# Altium footprint library RPIadaptor.PcbLib: 85 footprints (part 2 of 6)
Each footprint in its own frame and in the unit in brackets; x right, y up, seen from the top. Pads: shape width x height; smd on the part's side, far side on the other; paste and mask are expansions set on the pad; w line width, h text height; cw(c..) or ccw(c..) is an arc to the next point about the centre after c.
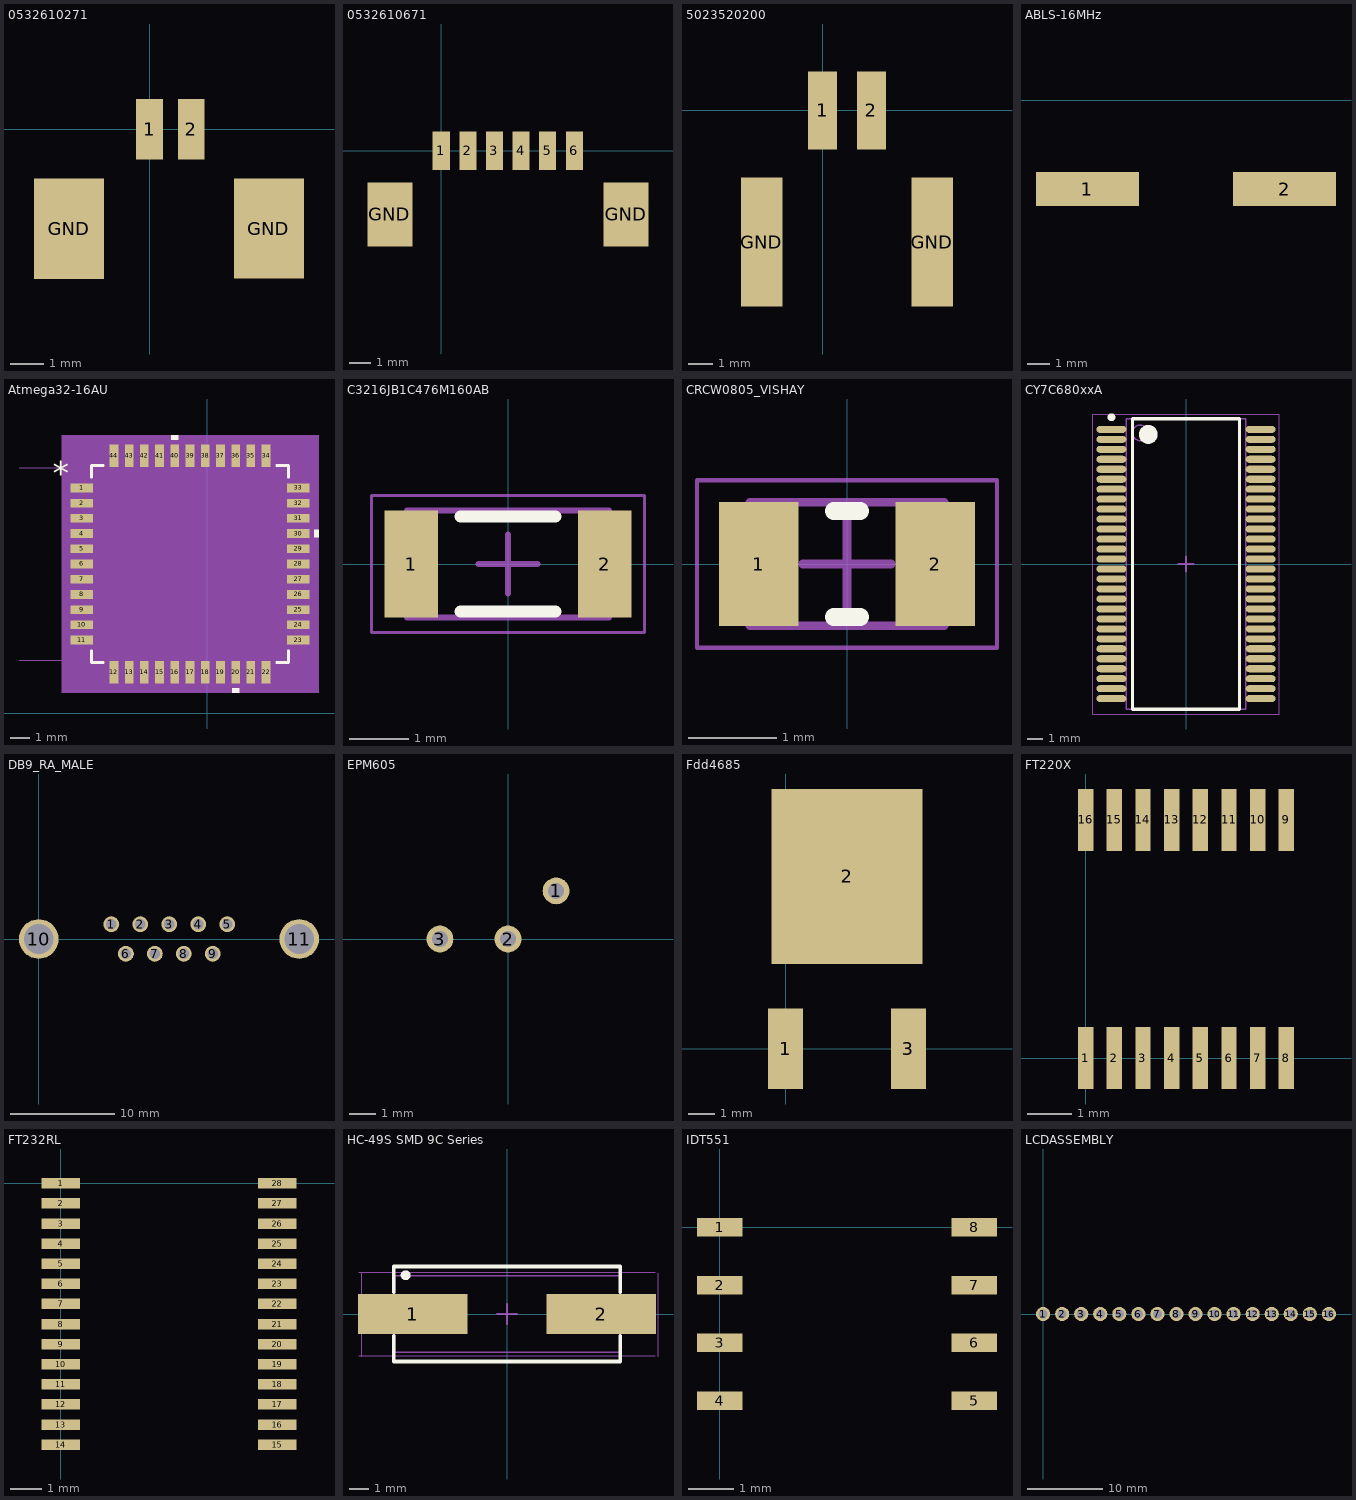
[diagram p1: the footprints below, top view; thin cyan lines are the x and y axes]

## 0532610271 [mm]
pads (4):
  rect 0.8x1.8 smd: 1(0,0) 2(1.25,0)
  rect 2.1x3 smd: GND(-2.41,-2.98) GND(3.575,-2.975)
3D body "532610271.stp": height 3.35, standoff -0.05, extent -3.225,-4.975 4.425,0.225

## 0532610671 [mm]
pads (8):
  rect 0.8x1.8 smd: 1(0,0) 2(1.25,0) 3(2.5,0) 4(3.75,0) 5(5,0) 6(6.25,0)
  rect 2.1x3 smd: GND(-2.41,-2.98) GND(8.68,-2.98)
3D body "532610671.stp": height 3.4, standoff 0, extent -3.205,-4.54 9.445,0.66

## 5023520200 [mm]
pads (4):
  rect 1.2x3.2 smd: 1(0,0) 2(2,0)
  rect 1.7x5.3 smd: GND(-2.5,-5.4) GND(4.5,-5.4)
3D body "5023520200.stp": height 6.46, standoff 0.06, extent -3,-8.4 5,1

## ABLS-16MHz [mil]
pads (2):
  rect 180x59.06 smd: 1(140,-155) 2(485,-155)
3D body: height 59.45, standoff -59.45, extent -75,40 -75,40
3D body "ABLS.STEP": height 160, standoff -4, extent 65.01,-247.49 565.01,-62.49

## Atmega32-16AU [mil]
pads (44):
  rect 46x18 smd paste+0 mask+0: 1(-260,466.48) 2(-260,434.98) 3(-260,403.49) 4(-260,371.99) 5(-260,340.5) 6(-260,309) 7(-260,277.5) 8(-260,246.01) 9(-260,214.51) 10(-260,183.02) 11(-260,151.52) 23(188,151.52) 24(188,183.02) 25(188,214.51) 26(188,246.01) 27(188,277.5) 28(188,309) 29(188,340.5) 30(188,371.99) 31(188,403.49) 32(188,434.98) 33(188,466.48)
  rect 18x46 smd paste+0 mask+0: 12(-193.48,85) 13(-161.98,85) 14(-130.49,85) 15(-98.99,85) 16(-67.5,85) 17(-36,85) 18(-4.5,85) 19(26.99,85) 20(58.49,85) 21(89.98,85) 22(121.48,85) 34(121.48,533) 35(89.98,533) 36(58.49,533) 37(26.99,533) 38(-4.5,533) 39(-36,533) 40(-67.5,533) 41(-98.99,533) 42(-130.49,533) 43(-161.98,533) 44(-193.48,533)
Top Overlay:
  region: -60,566 -75,566 -75,576 -60,576
  region: 221,379.49 231,379.49 231,364.49 221,364.49
  region: 65.99,52 50.99,52 50.99,42 65.99,42
  lines w6: -240,129.42 -240,105 -215.58,105 ; -240,488.58 -240,513 -215.58,513 ; 143.58,105 168,105 168,129.42 ; 143.58,513 168,513 168,488.58
  text "*" at -320.5,472.23 h50
Mechanical 5:
  region: 230,43 -302,43 -302,575 230,575
Mechanical 7:
  lines w1: -390,110 -193.48,110 ; -390,508 -193.48,508
Mechanical 13:
  drawing of 181 lines, arcs and shapes, not listed
  text "*" at -232.5,457.23 h50
Mechanical 15:
  region: -206.48,106 -239,106 -239,138.52 -287,138.52 -287,479.48 -239,479.48 -239,512 -206.48,512 -206.48,560 134.48,560 134.48,512 167,512 167,479.48 215,479.48 215,138.52 167,138.52 167,106 134.48,106 134.48,58 -206.48,58
  lines w6: -287,138.52 -287,479.48 -239,479.48 -239,512 -206.48,512 -206.48,560 134.48,560 134.48,512 167,512 167,479.48 215,479.48 215,138.52 167,138.52 167,106 134.48,106 134.48,58 -206.48,58 -206.48,106 -239,106 -239,138.52 -287,138.52
3D body "44A-L.step": height 47.09, standoff 0, extent -276.98,68.02 204.99,549.99
3D body: height 10, standoff 0, extent -36,309 -26,319

## C3216JB1C476M160AB [mm]
height 1.8
pads (2):
  rect 0.9x1.8 smd: 1(-1.625,0) 2(1.625,0)
Top Overlay:
  lines w0.2: -0.8,-0.8 0.8,-0.8 ; -0.8,0.8 0.8,0.8
Mechanical 13:
  lines w0.1: -1.7,-0.9 1.7,-0.9 1.7,0.9 -1.7,0.9 -1.7,-0.9
Mechanical 15:
  lines w0.05: -2.3,-1.15 2.3,-1.15 2.3,1.15 -2.3,1.15 -2.3,-1.15
  lines w0.1: -0.5,0 0.5,0 ; 0,-0.5 0,0.5
3D body "C3216JB1C476M160AB.step": height 1.8, standoff 0, extent -1.7,-0.9 1.7,0.9

## CRCW0805_VISHAY [mm]
height 0.5
pads (2):
  rect 0.9x1.4 smd: 1(-1,0) 2(1,0)
Top Overlay:
  lines w0.2: -0.15,-0.6 0.15,-0.6 ; -0.15,0.6 0.15,0.6
Mechanical 13:
  lines w0.1: -1.1,-0.7 -1.1,0.7 1.1,0.7 1.1,-0.7 -1.1,-0.7
Mechanical 15:
  lines w0.05: -1.7,-0.95 -1.7,0.95 1.7,0.95 1.7,-0.95 -1.7,-0.95
  lines w0.1: -0.5,0 0.5,0 ; 0,-0.5 0,0.5
3D body "CRCW0805_VISHAY.step": height 0.5, standoff 0, extent -1.1,-0.7 1.1,0.7

## CY7C680xxA [mm]
height 2.8
pads (56):
  oval 1.9x0.45 smd: 1(-4.75,8.572) 2(-4.75,7.938) 3(-4.75,7.302) 4(-4.75,6.667) 5(-4.75,6.032) 6(-4.75,5.397) 7(-4.75,4.763) 8(-4.75,4.127) 9(-4.75,3.492) 10(-4.75,2.857) 11(-4.75,2.222) 12(-4.75,1.587) 13(-4.75,0.953) 14(-4.75,0.318) 15(-4.75,-0.318) 16(-4.75,-0.953) 17(-4.75,-1.587) 18(-4.75,-2.222) 19(-4.75,-2.857) 20(-4.75,-3.492) 21(-4.75,-4.127) 22(-4.75,-4.763) 23(-4.75,-5.397) 24(-4.75,-6.032) 25(-4.75,-6.667) 26(-4.75,-7.302) 27(-4.75,-7.938) 28(-4.75,-8.572) 29(4.75,-8.572) 30(4.75,-7.938) 31(4.75,-7.302) 32(4.75,-6.667) 33(4.75,-6.032) 34(4.75,-5.397) 35(4.75,-4.763) 36(4.75,-4.127) 37(4.75,-3.492) 38(4.75,-2.857) 39(4.75,-2.222) 40(4.75,-1.587) 41(4.75,-0.953) 42(4.75,-0.318) 43(4.75,0.318) 44(4.75,0.953) 45(4.75,1.587) 46(4.75,2.222) 47(4.75,2.857) 48(4.75,3.492) 49(4.75,4.127) 50(4.75,4.763) 51(4.75,5.397) 52(4.75,6.032) 53(4.75,6.667) 54(4.75,7.302) 55(4.75,7.938) 56(4.75,8.572)
Top Overlay:
  circle w0.25: c-4.75,9.347 r0.125
  circle w0.6: c-2.4,8.25 r0.3
  lines w0.2: -3.4,-9.25 -3.4,9.25 3.4,9.25 3.4,-9.25 -3.4,-9.25
Mechanical 13:
  circle w0.1: c-2.9,8.35 r0.5
  lines w0.1: -3.8,-9.25 -3.8,9.25 3.8,9.25 3.8,-9.25 -3.8,-9.25
Mechanical 15:
  lines w0.05: -5.95,-9.55 -5.95,9.55 5.95,9.55 5.95,-9.55 -5.95,-9.55
  lines w0.1: -0.5,0 0.5,0 ; 0,-0.5 0,0.5
3D body "CY7C680xxA.step": height 2.79, standoff 0, extent -5.175,-9.25 5.175,9.25

## DB9_RA_MALE [mil]
pads (11):
  round 60 hole 39.37: 1(274,56) 2(383.5,56) 3(493,56) 4(602.5,56) 5(712,56) 6(329,-56) 7(438.5,-56) 8(548,-56) 9(657.5,-56)
  round 150 hole 111.81: 10(0,0) 11(983.86,0)
3D body "connector_a-ds_09_a_kg-t2.stp": height 497.05, standoff -167.32, extent -113.5,-617.28 1099.5,115

## EPM605 [mm]
pads (3):
  round 1 hole 0.6: 1(1.796,1.796) 2(0,0) 3(-2.54,0)
Bottom Overlay:
  lines w0.127: 3.562,4.321 ccw(c0,0) 4.29,3.6 ; 3.593,4.33 4.215,4.952 ; 4.218,4.952 4.939,4.231 4.317,3.608
3D body: height 1.25, standoff 0, extent 0,0 0,0

## Fdd4685 [mm]
pads (3):
  rect 1.3x3 smd: 1(0,0) 3(4.56,0)
  rect 5.6x6.5 smd: 2(2.28,6.4)
3D body "User Library-DPAK-1.STEP": height 2.41, standoff 0, extent -0.984,-0.858 5.556,9.081

## FT220X [mm]
pads (16):
  rect 0.35x1.4 smd: 1(0,0) 2(0.65,0) 3(1.3,0) 4(1.95,0) 5(2.6,0) 6(3.25,0) 7(3.9,0) 8(4.55,0) 9(4.55,5.4) 10(3.9,5.4) 11(3.25,5.4) 12(2.6,5.4) 13(1.95,5.4) 14(1.3,5.4) 15(0.65,5.4) 16(0,5.4)
3D body "User Library-TSSOP-16-1.STEP": height 1.1, standoff 0, extent -0.214,-0.533 4.786,5.867

## FT232RL [mm]
pads (28):
  rect 1.25x0.34 smd: 1(0,0) 2(0,-0.65) 3(0,-1.3) 4(0,-1.95) 5(0,-2.6) 6(0,-3.25) 7(0,-3.9) 8(0,-4.55) 9(0,-5.2) 10(0,-5.85) 11(0,-6.5) 12(0,-7.15) 13(0,-7.8) 14(0,-8.45) 15(7,-8.45) 16(7,-7.8) 17(7,-7.15) 18(7,-6.5) 19(7,-5.85) 20(7,-5.2) 21(7,-4.55) 22(7,-3.9) 23(7,-3.25) 24(7,-2.6) 25(7,-1.95) 26(7,-1.3) 27(7,-0.65) 28(7,0)
3D body "User Library-ssop28_model.STEP": height 2.01, standoff 0.01, extent -0.471,-9.311 7.329,0.889

## HC-49S SMD 9C Series [mm]
height 4.1
pads (2):
  rect 5.5x2 smd: 1(-4.75,0) 2(4.75,0)
Top Overlay:
  circle w0.25: c-5.1,1.95 r0.125
  lines w0.2: -5.7,-1.1 -5.7,-2.4 5.7,-2.4 5.7,-1.1 ; -5.7,1.1 -5.7,2.4 5.7,2.4 5.7,1.1
Mechanical 13:
  lines w0.1: -5.675,-1.925 5.675,-1.925 5.675,1.925 -5.675,1.925 -5.675,-1.925
Mechanical 15:
  lines w0.05: -7.45,-2.1 7.45,-2.1 ; -7.45,2.1 7.45,2.1 ; -7.3,-2.15 -7.3,2.05 ; 7.6,-2.15 7.6,2.05
  lines w0.1: -0.5,0 0.5,0 ; 0,-0.5 0,0.5
3D body "HC-49S SMD 9C Series.step": height 4.1, standoff 0, extent -6.2,-1.925 6.5,1.925

## IDT551 [mil]
pads (8):
  rect 39.37x16 smd: 1(0,0) 2(0,-50) 3(0,-100) 4(0,-150) 5(220,-150) 6(220,-100) 7(220,-50) 8(220,0)
3D body "User Library-SOIC-8-1.STEP": height 68.9, standoff 0, extent -8.1,-171.46 228.12,21.46

## LCDASSEMBLY [mm]
pads (16):
  round 1.9 hole 1.2: 1(0,0) 2(2.54,0) 3(5.08,0) 4(7.62,0) 5(10.16,0) 6(12.7,0) 7(15.24,0) 8(17.78,0) 9(20.32,0) 10(22.86,0) 11(25.4,0) 12(27.94,0) 13(30.48,0) 14(33.02,0) 15(35.56,0) 16(38.1,0)
3D body "User Library-LCD1602.step": height 37.76, standoff 1.76, extent -8.001,0.65 71.999,12.7
3D body "Pin Header 1x16 TH Angle Pitch 2.54mm.stp": height 4.13, standoff -6.99, extent -1.27,-1.397 39.375,4.893